# Altium footprint library myPcbLib.PcbLib: 987 footprints (part 53 of 62)
Each footprint in its own frame and in the unit in brackets; x right, y up, seen from the top. Pads: shape width x height; smd on the part's side, far side on the other; paste and mask are expansions set on the pad; w line width, h text height; cw(c..) or ccw(c..) is an arc to the next point about the centre after c.
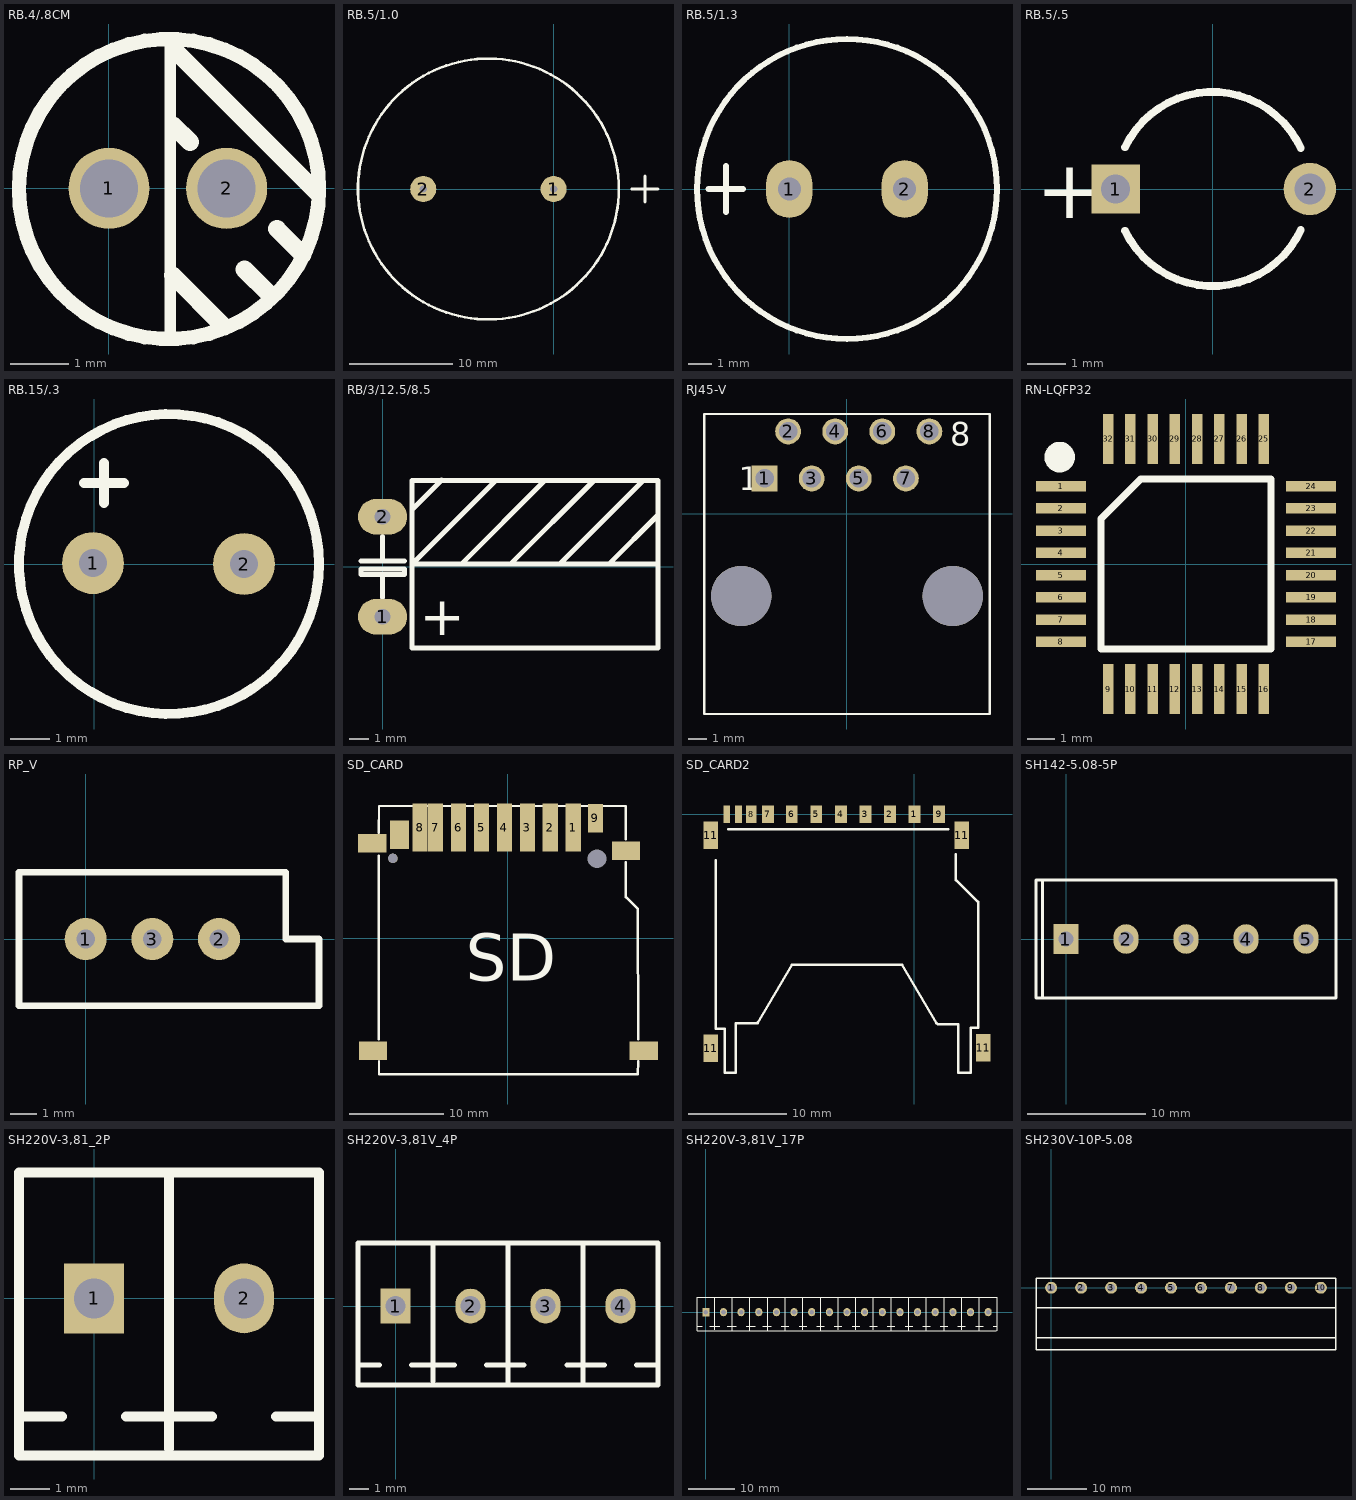
[diagram p52: the footprints below, top view; thin cyan lines are the x and y axes]

## RB.4/.8CM [mm]
pads (2):
  round 1.4 hole 1: 1(0,0) 2(2.032,0)
Top Overlay:
  circle w0.25: c1.037,-0.011 r2.591
  lines w0.2: 1.058,-2.508 1.058,2.519
  lines w0.305: 1.101,-1.503 1.979,-2.381 ; 1.111,1.09 1.401,0.801 ; 1.154,2.371 3.581,-0.057 ; 2.342,-1.4 2.773,-1.831 ; 2.901,-0.7 3.344,-1.143

## RB.5/1.0 [mil]
pads (2):
  round 100 hole 28: 1(0,0) 2(-500,0)
Top Overlay:
  circle w10: c-250,0 r500
  lines w10: 300,0 400,0 ; 350,-50 350,50

## RB.5/1.3 [mm]
pads (2):
  oval 2x2.5 hole 1: 1(0,0) 2(5,0)
Top Overlay:
  circle w0.254: c2.5,0 r6.5
  lines w0.254: -3.5,0 -2,0 ; -2.75,-1 -2.75,1

## RB.5/.5 [mm]
height 12
pads (2):
  rect 1.25x1.25 hole 0.75: 1(-2.5,0)
  round 1.35 hole 0.8: 2(2.5,0)
Top Overlay:
  lines w0.2: -2.257,-1.075 ccw(c0,0) 2.269,-1.05 ; -2.257,1.075 cw(c0,0) 2.269,1.05
  text "+" at -4.55,-0.75 h1.5

## RB.15/.3 [mil]
pads (2):
  round 62 hole 28: 1(-0.99,0.94) 2(150,0)
Top Overlay:
  circle w10: c75,0 r150
  lines w10: -10,80.94 30,80.94 ; 10,60.94 10,100.94

## RB/3/12.5/8.5 [mm]
pads (2):
  oval 2.5x1.8 hole 0.8: 1(0,-2.54) 2(0,2.54)
Top Overlay:
  lines w0.254: -1.1,0.3 1.1,0.3 ; 0,-1.55 0,-0.4 ; 0,0.3 0,1.55 ; 1.492,2.9 2.992,4.4 ; 3.992,0.135 8.242,4.385 ; 5.742,4.385 1.492,0.135 13.992,0.135 ; 6.492,0.135 10.742,4.385 ; 8.992,0.135 13.242,4.385 ; 11.492,0.135 13.992,2.635 ; -1.1,-0.4 1.1,-0.4 1.1,-0.1 -1.1,-0.1 -1.1,-0.4 ; 1.492,-4.115 13.992,-4.115 13.992,4.385 1.492,4.385 1.492,-4.115
  text "+" at 1.892,-3.49 h2

## RJ45-V [mm] "RJ45 Vertical"
height 16.4
pads (10):
  rect 1.4x1.4 hole 1: 1(-4.445,1.905)
  round 1.4 hole 1: 2(-3.175,4.445) 3(-1.905,1.905) 4(-0.635,4.445) 5(0.635,1.905) 6(1.905,4.445) 7(3.175,1.905) 8(4.445,4.445)
  round 3.25 hole 3.25 unplated: ""(-5.715,-4.445) ""(5.715,-4.445)
Top Overlay:
  lines w0.127: -7.707,-10.815 7.708,-10.815 ; -7.707,-10.815 -7.707,5.385 ; -7.707,-10.815 7.708,-10.815 ; -7.707,-10.815 -7.707,5.385 ; -7.707,5.385 7.708,5.385 ; -7.707,5.385 7.708,5.385 ; 7.708,-10.815 7.708,5.385 ; 7.708,-10.815 7.708,5.385
  text "1" at -5.842,1.27 h1.27
  text "8" at 5.588,3.683 h1.27
3D body "615008138021.stp": height 2.99, standoff -16.91, extent -7.692,-10.815 7.708,5.385

## RN-LQFP32 [mm]
pads (32):
  rect 1.8x0.38 smd: 1(-4.5,2.802) 2(-4.5,2.002) 3(-4.5,1.202) 4(-4.5,0.402) 5(-4.5,-0.398) 6(-4.5,-1.198) 7(-4.5,-1.998) 8(-4.5,-2.798) 17(4.5,-2.798) 18(4.5,-1.998) 19(4.5,-1.198) 20(4.5,-0.398) 21(4.5,0.402) 22(4.5,1.202) 23(4.5,2.002) 24(4.5,2.802)
  rect 0.38x1.8 smd: 9(-2.8,-4.498) 10(-2,-4.498) 11(-1.2,-4.498) 12(-0.4,-4.498) 13(0.4,-4.498) 14(1.2,-4.498) 15(2,-4.498) 16(2.8,-4.498) 25(2.8,4.502) 26(2,4.502) 27(1.2,4.502) 28(0.4,4.502) 29(-0.4,4.502) 30(-1.2,4.502) 31(-2,4.502) 32(-2.8,4.502)
Top Overlay:
  lines w0.254: -3.065,-3.063 -3.065,1.632 -1.63,3.067 3.065,3.067 3.065,-3.063 -3.065,-3.063
  lines w0.6: -4.3,3.85 cw(c-4.55,3.85) -4.3,3.85

## RP_V [mm]
pads (3):
  round 1.6 hole 0.711: 1(0,0) 2(5.08,0) 3(2.54,0)
Top Overlay:
  lines w0.254: -2.54,-2.54 8.89,-2.54 8.89,0 7.62,0 7.62,2.54 -2.54,2.54 -2.54,-2.54

## SD_CARD [mm]
pads (16):
  rect 1.6x5.08 smd: 1(6.913,11.712) 2(4.483,11.712) 3(2.053,11.712) 4(-0.377,11.712) 5(-2.807,11.712) 6(-5.237,11.712) 7(-7.667,11.712) 8(-9.327,11.712)
  rect 1.6x3 smd: 9(9.273,12.712)
  rect 3x2 smd: ""(-14.4,10.05) ""(-14.3,-11.95) ""(12.5,9.25) ""(14.4,-11.95)
  round 1 hole 1: ""(-12.2,8.45)
  rect 2x3 smd: ""(-11.5,10.95)
  round 1.8 hole 2: ""(9.444,8.41)
Top Overlay:
  lines w0.254: -13.7,-10.75 -13.7,8.75 ; -13.7,11.15 -13.67,13.998 12.492,13.998 12.5,10.45 ; -13.67,-13.05 -13.67,-14.45 13.762,-14.45 13.8,-13.05 ; 12.5,8.05 12.492,4.346 13.762,3.076 13.8,-10.75
  text "SD" at -4.5,-4.55 h5

## SD_CARD2 [mm]
pads (15):
  rect 1.2x1.8 smd: 1(0,0) 2(-2.489,0) 3(-4.983,-0.009) 4(-7.483,-0.009) 5(-9.983,-0.009) 6(-12.483,-0.009) 7(-14.908,-0.009) 9(2.517,-0.009)
  rect 1.1x1.8 smd: 8(-16.612,0)
  rect 1.5x2.8 smd: 11(-20.726,-23.834) 11(-20.726,-2.143) 11(4.826,-2.143) 11(7.01,-23.784)
  rect 0.7x1.8 smd: 11(-17.908,-0.009) " 11"(-19.101,0)
Top Overlay:
  lines w0.254: -20.193,-4.699 -20.193,-21.844 -19.304,-21.844 -19.304,-26.3 -18.158,-26.3 -18.158,-21.3 ; -18.923,-1.524 3.429,-1.524 ; -18.107,-21.294 -16.065,-21.294 -15.907,-21.136 ; -15.958,-21.294 -12.446,-15.3 ; -12.458,-15.3 -1.258,-15.3 2.242,-21.294 ; 2.242,-21.244 2.4,-21.402 4.442,-21.402 4.442,-26.3 5.715,-26.3 5.715,-21.717 6.477,-21.717 6.477,-8.899 6.442,-8.899 6.431,-8.899 4.242,-6.71 4.191,-6.71 4.191,-4.064
Multi-Layer:
  circle w0.254: c-18.39,-3.3 r0.58
  circle w0.254: c2.642,-3.26 r0.82

## SH142-5.08-5P [mm]
pads (5):
  rect 2.1x2.5 hole 1.3: 1(0,0)
  oval 2.1x2.5 hole 1.3: 2(5.08,0) 3(10.16,0) 4(15.24,0) 5(20.32,0)
Top Overlay:
  lines w0.254: -2,-5 -2,5 ; -2.54,-5 -2.54,0 -2.54,5 22.86,5 22.86,0 22.86,-5 -2.54,-5

## SH220V-3,81_2P [mil]
height 60
pads (2):
  rect 60x70 hole 40: 1(0,0)
  oval 60x70 hole 40: 2(150,0)
Top Overlay:
  lines w10: -75,-118.11 -31.89,-118.11 ; 31.89,-118.11 118.11,-118.11 ; 75,-150 75,-75 75,125.98 ; 181.89,-118.11 225,-118.11 ; -75,-157.48 225,-157.48 ; -75,-157.48 -75,-75 -75,125.98 225,125.98 225,-157.48 ; -75,-157.48 225,-157.48

## SH220V-3,81V_4P [mil]
height 60
pads (4):
  rect 60x70 hole 40: 1(0,0)
  oval 60x70 hole 40: 2(150,0) 3(300,0) 4(450,0)
Top Overlay:
  lines w10: -75,-118.11 -31.89,-118.11 ; 31.89,-118.11 118.11,-118.11 ; 75,-150 75,-75 75,125.98 ; 181.89,-118.11 256.89,-118.11 ; 225,-157.48 225,125.98 ; 276.41,-157.48 -75,-157.48 ; 343.11,-118.11 418.11,-118.11 ; 375,-157.48 375,-150 375,125.98 ; 481.89,-118.11 525,-118.11 ; 522,125.98 -75,125.98 -75,-75 -75,-157.48 ; 525,125.98 525,-75 525,-118.11 ; -75,-157.48 525,-157.48 525,-118.11

## SH220V-3,81V_17P [mil]
height 60
pads (17):
  rect 60x70 hole 40: 1(0,0)
  oval 60x70 hole 40: 2(150,0) 3(300,0) 4(450,0) 5(600,0) 6(750,0) 7(900,0) 8(1050,0) 9(1200,0) 10(1350,0) 11(1500,0) 12(1650,0) 13(1800,0) 14(1950,0) 15(2100,0) 16(2250,0) 17(2400,0)
Top Overlay:
  lines w10: -75,-118.11 -31.89,-118.11 ; 31.89,-118.11 118.11,-118.11 ; 75,-150 75,-75 75,125.98 ; 181.89,-118.11 256.89,-118.11 ; 225,-157.48 225,125.98 ; 276.41,-157.48 -75,-157.48 ; 343.11,-118.11 418.11,-118.11 ; 375,-157.48 375,-150 375,125.98 ; 481.89,-118.11 525,-118.11 ; 525,-157.48 525,-118.11 ; 525,125.98 525,-75 525,-118.11 ; 556.89,-118.11 525,-118.11 ; 643.11,-118.11 706.89,-118.11 ; 675,-157.48 675,-150 675,125.98 ; 793.11,-118.11 856.89,-118.11 ; 825,-150 825,125.98 ; 943.11,-118.11 1006.89,-118.11 ; 975,-157.48 975,-150 975,125.98 ; 1093.11,-118.11 1156.89,-118.11 ; 1125,-150 1125,125.98 ; 1243.11,-118.11 1306.89,-118.11 ; 1275,-150 1275,125.98 ; 1393.11,-118.11 1456.89,-118.11 ; 1425,-150 1425,125.98 ; 1543.11,-118.11 1606.89,-118.11 ; 1575,-157.48 1575,-150 1575,125.98 ; 1693.11,-118.11 1756.89,-118.11 ; 1725,-157.48 1725,-150 1725,125.98 ; 1843.11,-118.11 1906.89,-118.11 ; 1875,-157.48 1875,-150 1875,125.98 ; 1993.11,-118.11 2056.89,-118.11 ; 2025,-157.48 2025,-150 2025,125.98 ; 2143.11,-118.11 2206.89,-118.11 ; 2175,-150 2175,125.98 ; 2266.67,-16.67 2266.67,16.67 ; 2293.11,-118.11 2356.89,-118.11 ; 2325,-157.48 2325,-150 2325,125.98 ; 2443.11,-118.11 2475,-118.11 ; 2467.52,-157.48 -75,-157.48 ; 2475,-157.48 2475,-150 2475,125.98 -75,125.98 -75,-75 -75,-157.48

## SH230V-10P-5.08 [mil]
height 322.83
pads (10):
  round 80 hole 52: 1(0,0) 2(200,0) 3(400,0) 4(600,0) 5(800,0) 6(1000,0) 7(1200,0) 8(1400,0) 9(1600,0) 10(1800,0)
Top Overlay:
  lines w10: -101,-334 1899,-334 ; -99,-133.86 1901,-133.86 ; -100,-413.39 1900,-413.39 1900,62.99 -100,62.99 -100,-413.39